# Altium schematic symbol library jlcpcb_2025_04_capacitors_extended_0402.schlib: 3594 symbols (part 12 of 20) (continued)
## FN15N3R3B500PNG
designator C?  Capacitance: 3.3pF  (hidden comment: *)
Capacitor, Ceramic (MLCC), 3.3pF, 50V, C0G, SMD 0402; Manufacturer: PSA(Prosperity Dielectrics); Manufacturer Part Number: FN15N3R3B500PNG; Package Size: 0402; JLCPCB Basic Part: No; JLCPCB Part Number: C565490; Supplier 1: LCSC; Category: Capacitors - MLCC; Supplier Part Number 1: C565490; Voltage Rating: 50V; Temperature Coefficient: C0G; RoHS: Yes; ComponentLink1Description: Datasheet; ComponentLink2Description: JLCPCB Part URL; ComponentLink2URL: https://jlcpcb.com/partdetail/C565490; ComponentLink3Description: LCSC Part URL; ComponentLink3URL: https://lcsc.com/product-detail/Multilayer-Ceramic-Capacitors-MLCC---SMD-SMT_PSAProsperity-Dielectrics-PSAProsperity-Dielectrics-FN15N3R3B500PNG_C565490.html
footprint CAP-0402 (0402 (1005M) Capacitor)
pins: 1, 2

## FN15N3R3C500PNG
designator C?  Capacitance: 3.3pF  (hidden comment: *)
Capacitor, Ceramic (MLCC), 3.3pF, 50V, C0G, SMD 0402; Manufacturer: PSA(Prosperity Dielectrics); Manufacturer Part Number: FN15N3R3C500PNG; Package Size: 0402; JLCPCB Basic Part: No; JLCPCB Part Number: C363519; Supplier 1: LCSC; Category: Capacitors - MLCC; Supplier Part Number 1: C363519; Voltage Rating: 50V; Temperature Coefficient: C0G; RoHS: Yes; ComponentLink1Description: Datasheet; ComponentLink1URL: https://wmsc.lcsc.com/wmsc/upload/file/pdf/v2/lcsc/2304140030_PSA-Prosperity-Dielectrics-FN15N3R3C500PNG_C363519.pdf; ComponentLink2Description: JLCPCB Part URL; ComponentLink2URL: https://jlcpcb.com/partdetail/C363519; ComponentLink3Description: LCSC Part URL; ComponentLink3URL: https://lcsc.com/product-detail/Multilayer-Ceramic-Capacitors-MLCC---SMD-SMT_PSAProsperity-Dielectrics-PSAProsperity-Dielectrics-FN15N3R3C500PNG_C363519.html
footprint CAP-0402 (0402 (1005M) Capacitor)
pins: 1, 2

## FN15N3R9B500PNG
designator C?  Capacitance: 3.9pF  (hidden comment: *)
Capacitor, Ceramic (MLCC), 3.9pF, 50V, C0G, SMD 0402; Manufacturer: PSA(Prosperity Dielectrics); Manufacturer Part Number: FN15N3R9B500PNG; Package Size: 0402; JLCPCB Basic Part: No; JLCPCB Part Number: C565491; Supplier 1: LCSC; Category: Capacitors - MLCC; Supplier Part Number 1: C565491; Voltage Rating: 50V; Temperature Coefficient: C0G; RoHS: Yes; ComponentLink1Description: Datasheet; ComponentLink2Description: JLCPCB Part URL; ComponentLink2URL: https://jlcpcb.com/partdetail/C565491; ComponentLink3Description: LCSC Part URL; ComponentLink3URL: https://lcsc.com/product-detail/Multilayer-Ceramic-Capacitors-MLCC---SMD-SMT_PSAProsperity-Dielectrics-PSAProsperity-Dielectrics-FN15N3R9B500PNG_C565491.html
footprint CAP-0402 (0402 (1005M) Capacitor)
pins: 1, 2

## FN15N3R9C500PNG
designator C?  Capacitance: 3.9pF  (hidden comment: *)
Capacitor, Ceramic (MLCC), 3.9pF, 50V, C0G, SMD 0402; Manufacturer: PSA(Prosperity Dielectrics); Manufacturer Part Number: FN15N3R9C500PNG; Package Size: 0402; JLCPCB Basic Part: No; JLCPCB Part Number: C525213; Supplier 1: LCSC; Category: Capacitors - MLCC; Supplier Part Number 1: C525213; Voltage Rating: 50V; Temperature Coefficient: C0G; RoHS: Yes; ComponentLink1Description: Datasheet; ComponentLink1URL: https://wmsc.lcsc.com/wmsc/upload/file/pdf/v2/lcsc/2304140030_PSA-Prosperity-Dielectrics-FN15N3R9C500PNG_C525213.pdf; ComponentLink2Description: JLCPCB Part URL; ComponentLink2URL: https://jlcpcb.com/partdetail/C525213; ComponentLink3Description: LCSC Part URL; ComponentLink3URL: https://lcsc.com/product-detail/Multilayer-Ceramic-Capacitors-MLCC---SMD-SMT_PSAProsperity-Dielectrics-PSAProsperity-Dielectrics-FN15N3R9C500PNG_C525213.html
footprint CAP-0402 (0402 (1005M) Capacitor)
pins: 1, 2

## FN15N4R0C500PNG
designator C?  Capacitance: 4pF  (hidden comment: *)
Capacitor, Ceramic (MLCC), 4pF, 50V, C0G, SMD 0402; Manufacturer: PSA(Prosperity Dielectrics); Manufacturer Part Number: FN15N4R0C500PNG; Package Size: 0402; JLCPCB Basic Part: No; JLCPCB Part Number: C2847445; Supplier 1: LCSC; Category: Capacitors - MLCC; Supplier Part Number 1: C2847445; Voltage Rating: 50V; Temperature Coefficient: C0G; RoHS: Yes; ComponentLink1Description: Datasheet; ComponentLink1URL: https://wmsc.lcsc.com/wmsc/upload/file/pdf/v2/lcsc/2108142230_PSA-Prosperity-Dielectrics-FN15N4R0C500PNG_C2847445.pdf; ComponentLink2Description: JLCPCB Part URL; ComponentLink2URL: https://jlcpcb.com/partdetail/C2847445; ComponentLink3Description: LCSC Part URL; ComponentLink3URL: https://lcsc.com/product-detail/Multilayer-Ceramic-Capacitors-MLCC---SMD-SMT_PSAProsperity-Dielectrics-PSAProsperity-Dielectrics-FN15N4R0C500PNG_C2847445.html
footprint CAP-0402 (0402 (1005M) Capacitor)
pins: 1, 2

## FN15N4R3B500PNG
designator C?  Capacitance: 4.3pF  (hidden comment: *)
Capacitor, Ceramic (MLCC), 4.3pF, 50V, C0G, SMD 0402; Manufacturer: PSA(Prosperity Dielectrics); Manufacturer Part Number: FN15N4R3B500PNG; Package Size: 0402; JLCPCB Basic Part: No; JLCPCB Part Number: C2929130; Supplier 1: LCSC; Category: Capacitors - MLCC; Supplier Part Number 1: C2929130; Voltage Rating: 50V; Temperature Coefficient: C0G; RoHS: Yes; ComponentLink1Description: Datasheet; ComponentLink1URL: https://wmsc.lcsc.com/wmsc/upload/file/pdf/v2/lcsc/2201121400_PSA-Prosperity-Dielectrics-FN15N4R3B500PNG_C2929130.pdf; ComponentLink2Description: JLCPCB Part URL; ComponentLink2URL: https://jlcpcb.com/partdetail/C2929130; ComponentLink3Description: LCSC Part URL; ComponentLink3URL: https://lcsc.com/product-detail/Multilayer-Ceramic-Capacitors-MLCC---SMD-SMT_PSAProsperity-Dielectrics-PSAProsperity-Dielectrics-FN15N4R3B500PNG_C2929130.html
footprint CAP-0402 (0402 (1005M) Capacitor)
pins: 1, 2

## FN15N4R7B500PNG
designator C?  Capacitance: 4.7pF  (hidden comment: *)
Capacitor, Ceramic (MLCC), 4.7pF, 50V, C0G, SMD 0402; Manufacturer: PSA(Prosperity Dielectrics); Manufacturer Part Number: FN15N4R7B500PNG; Package Size: 0402; JLCPCB Basic Part: No; JLCPCB Part Number: C565492; Supplier 1: LCSC; Category: Capacitors - MLCC; Supplier Part Number 1: C565492; Voltage Rating: 50V; Temperature Coefficient: C0G; RoHS: Yes; ComponentLink1Description: Datasheet; ComponentLink2Description: JLCPCB Part URL; ComponentLink2URL: https://jlcpcb.com/partdetail/C565492; ComponentLink3Description: LCSC Part URL; ComponentLink3URL: https://lcsc.com/product-detail/Multilayer-Ceramic-Capacitors-MLCC---SMD-SMT_PSAProsperity-Dielectrics-PSAProsperity-Dielectrics-FN15N4R7B500PNG_C565492.html
footprint CAP-0402 (0402 (1005M) Capacitor)
pins: 1, 2

## FN15N4R7C500PNG
designator C?  Capacitance: 4.7pF  (hidden comment: *)
Capacitor, Ceramic (MLCC), 4.7pF, 50V, C0G, SMD 0402; Manufacturer: PSA(Prosperity Dielectrics); Manufacturer Part Number: FN15N4R7C500PNG; Package Size: 0402; JLCPCB Basic Part: No; JLCPCB Part Number: C525216; Supplier 1: LCSC; Category: Capacitors - MLCC; Supplier Part Number 1: C525216; Voltage Rating: 50V; Temperature Coefficient: C0G; RoHS: Yes; ComponentLink1Description: Datasheet; ComponentLink1URL: https://wmsc.lcsc.com/wmsc/upload/file/pdf/v2/lcsc/2304140030_PSA-Prosperity-Dielectrics-FN15N4R7C500PNG_C525216.pdf; ComponentLink2Description: JLCPCB Part URL; ComponentLink2URL: https://jlcpcb.com/partdetail/C525216; ComponentLink3Description: LCSC Part URL; ComponentLink3URL: https://lcsc.com/product-detail/Multilayer-Ceramic-Capacitors-MLCC---SMD-SMT_PSAProsperity-Dielectrics-PSAProsperity-Dielectrics-FN15N4R7C500PNG_C525216.html
footprint CAP-0402 (0402 (1005M) Capacitor)
pins: 1, 2

## FN15N5R0C500PNG
designator C?  Capacitance: 5pF  (hidden comment: *)
Capacitor, Ceramic (MLCC), 5pF, 50V, C0G, SMD 0402; Manufacturer: PSA(Prosperity Dielectrics); Manufacturer Part Number: FN15N5R0C500PNG; Package Size: 0402; JLCPCB Basic Part: No; JLCPCB Part Number: C363521; Supplier 1: LCSC; Category: Capacitors - MLCC; Supplier Part Number 1: C363521; Voltage Rating: 50V; Temperature Coefficient: C0G; RoHS: Yes; ComponentLink1Description: Datasheet; ComponentLink1URL: https://wmsc.lcsc.com/wmsc/upload/file/pdf/v2/lcsc/2304140030_PSA-Prosperity-Dielectrics-FN15N5R0C500PNG_C363521.pdf; ComponentLink2Description: JLCPCB Part URL; ComponentLink2URL: https://jlcpcb.com/partdetail/C363521; ComponentLink3Description: LCSC Part URL; ComponentLink3URL: https://lcsc.com/product-detail/Multilayer-Ceramic-Capacitors-MLCC---SMD-SMT_PSAProsperity-Dielectrics-PSAProsperity-Dielectrics-FN15N5R0C500PNG_C363521.html
footprint CAP-0402 (0402 (1005M) Capacitor)
pins: 1, 2

## FN15N5R6C500PNG
designator C?  Capacitance: 5.6pF  (hidden comment: *)
Capacitor, Ceramic (MLCC), 5.6pF, 50V, NP0, SMD 0402; Manufacturer: PSA(Prosperity Dielectrics); Manufacturer Part Number: FN15N5R6C500PNG; Package Size: 0402; JLCPCB Basic Part: No; JLCPCB Part Number: C525218; Supplier 1: LCSC; Category: Capacitors - MLCC; Supplier Part Number 1: C525218; Voltage Rating: 50V; Temperature Coefficient: NP0; RoHS: Yes; ComponentLink1Description: Datasheet; ComponentLink1URL: https://wmsc.lcsc.com/wmsc/upload/file/pdf/v2/lcsc/2304140030_PSA-Prosperity-Dielectrics-FN15N5R6C500PNG_C525218.pdf; ComponentLink2Description: JLCPCB Part URL; ComponentLink2URL: https://jlcpcb.com/partdetail/C525218; ComponentLink3Description: LCSC Part URL; ComponentLink3URL: https://lcsc.com/product-detail/Multilayer-Ceramic-Capacitors-MLCC---SMD-SMT_PSAProsperity-Dielectrics-PSAProsperity-Dielectrics-FN15N5R6C500PNG_C525218.html
footprint CAP-0402 (0402 (1005M) Capacitor)
pins: 1, 2

## FN15N5R6D500PNG
designator C?  Capacitance: 5.6pF  (hidden comment: *)
Capacitor, Ceramic (MLCC), 5.6pF, 50V, C0G, SMD 0402; Manufacturer: PSA(Prosperity Dielectrics); Manufacturer Part Number: FN15N5R6D500PNG; Package Size: 0402; JLCPCB Basic Part: No; JLCPCB Part Number: C525219; Supplier 1: LCSC; Category: Capacitors - MLCC; Supplier Part Number 1: C525219; Voltage Rating: 50V; Temperature Coefficient: C0G; RoHS: Yes; ComponentLink1Description: Datasheet; ComponentLink1URL: https://wmsc.lcsc.com/wmsc/upload/file/pdf/v2/lcsc/2304140030_PSA-Prosperity-Dielectrics-FN15N5R6D500PNG_C525219.pdf; ComponentLink2Description: JLCPCB Part URL; ComponentLink2URL: https://jlcpcb.com/partdetail/C525219; ComponentLink3Description: LCSC Part URL; ComponentLink3URL: https://lcsc.com/product-detail/Multilayer-Ceramic-Capacitors-MLCC---SMD-SMT_PSAProsperity-Dielectrics-PSAProsperity-Dielectrics-FN15N5R6D500PNG_C525219.html
footprint CAP-0402 (0402 (1005M) Capacitor)
pins: 1, 2

## FN15N6R0D500PNG
designator C?  Capacitance: 6pF  (hidden comment: *)
Capacitor, Ceramic (MLCC), 6pF, 50V, C0G, SMD 0402; Manufacturer: PSA(Prosperity Dielectrics); Manufacturer Part Number: FN15N6R0D500PNG; Package Size: 0402; JLCPCB Basic Part: No; JLCPCB Part Number: C2875129; Supplier 1: LCSC; Category: Capacitors - MLCC; Supplier Part Number 1: C2875129; Voltage Rating: 50V; Temperature Coefficient: C0G; RoHS: Yes; ComponentLink1Description: Datasheet; ComponentLink1URL: https://wmsc.lcsc.com/wmsc/upload/file/pdf/v2/lcsc/2109171130_PSA-Prosperity-Dielectrics-FN15N6R0D500PNG_C2875129.pdf; ComponentLink2Description: JLCPCB Part URL; ComponentLink2URL: https://jlcpcb.com/partdetail/C2875129; ComponentLink3Description: LCSC Part URL; ComponentLink3URL: https://lcsc.com/product-detail/Multilayer-Ceramic-Capacitors-MLCC---SMD-SMT_PSAProsperity-Dielectrics-PSAProsperity-Dielectrics-FN15N6R0D500PNG_C2875129.html
footprint CAP-0402 (0402 (1005M) Capacitor)
pins: 1, 2

## FN15N6R8C500PNG
designator C?  Capacitance: 6.8pF  (hidden comment: *)
Capacitor, Ceramic (MLCC), 6.8pF, 50V, SMD 0402; Manufacturer: PSA(Prosperity Dielectrics); Manufacturer Part Number: FN15N6R8C500PNG; Package Size: 0402; JLCPCB Basic Part: No; JLCPCB Part Number: C565493; Supplier 1: LCSC; Category: Capacitors - MLCC; Supplier Part Number 1: C565493; Voltage Rating: 50V; RoHS: Yes; ComponentLink1Description: Datasheet; ComponentLink2Description: JLCPCB Part URL; ComponentLink2URL: https://jlcpcb.com/partdetail/C565493; ComponentLink3Description: LCSC Part URL; ComponentLink3URL: https://lcsc.com/product-detail/Multilayer-Ceramic-Capacitors-MLCC---SMD-SMT_PSAProsperity-Dielectrics-PSAProsperity-Dielectrics-FN15N6R8C500PNG_C565493.html
footprint CAP-0402 (0402 (1005M) Capacitor)
pins: 1, 2

## FN15N6R8D500PNG
designator C?  Capacitance: 6.8pF  (hidden comment: *)
Capacitor, Ceramic (MLCC), 6.8pF, 50V, C0G, SMD 0402; Manufacturer: PSA(Prosperity Dielectrics); Manufacturer Part Number: FN15N6R8D500PNG; Package Size: 0402; JLCPCB Basic Part: No; JLCPCB Part Number: C525221; Supplier 1: LCSC; Category: Capacitors - MLCC; Supplier Part Number 1: C525221; Voltage Rating: 50V; Temperature Coefficient: C0G; RoHS: Yes; ComponentLink1Description: Datasheet; ComponentLink1URL: https://wmsc.lcsc.com/wmsc/upload/file/pdf/v2/lcsc/2304140030_PSA-Prosperity-Dielectrics-FN15N6R8D500PNG_C525221.pdf; ComponentLink2Description: JLCPCB Part URL; ComponentLink2URL: https://jlcpcb.com/partdetail/C525221; ComponentLink3Description: LCSC Part URL; ComponentLink3URL: https://lcsc.com/product-detail/Multilayer-Ceramic-Capacitors-MLCC---SMD-SMT_PSAProsperity-Dielectrics-PSAProsperity-Dielectrics-FN15N6R8D500PNG_C525221.html
footprint CAP-0402 (0402 (1005M) Capacitor)
pins: 1, 2

## FN15N7R0C500PNG
designator C?  Capacitance: 7pF  (hidden comment: *)
Capacitor, Ceramic (MLCC), 7pF, 50V, C0G, SMD 0402; Manufacturer: PSA(Prosperity Dielectrics); Manufacturer Part Number: FN15N7R0C500PNG; Package Size: 0402; JLCPCB Basic Part: No; JLCPCB Part Number: C363522; Supplier 1: LCSC; Category: Capacitors - MLCC; Supplier Part Number 1: C363522; Voltage Rating: 50V; Temperature Coefficient: C0G; RoHS: Yes; ComponentLink1Description: Datasheet; ComponentLink1URL: https://wmsc.lcsc.com/wmsc/upload/file/pdf/v2/lcsc/2304140030_PSA-Prosperity-Dielectrics-FN15N7R0C500PNG_C363522.pdf; ComponentLink2Description: JLCPCB Part URL; ComponentLink2URL: https://jlcpcb.com/partdetail/C363522; ComponentLink3Description: LCSC Part URL; ComponentLink3URL: https://lcsc.com/product-detail/Multilayer-Ceramic-Capacitors-MLCC---SMD-SMT_PSAProsperity-Dielectrics-PSAProsperity-Dielectrics-FN15N7R0C500PNG_C363522.html
footprint CAP-0402 (0402 (1005M) Capacitor)
pins: 1, 2

## FN15N8R2C500PNG
designator C?  Capacitance: 8.2pF  (hidden comment: *)
Capacitor, Ceramic (MLCC), 8.2pF, 50V, C0G, SMD 0402; Manufacturer: PSA(Prosperity Dielectrics); Manufacturer Part Number: FN15N8R2C500PNG; Package Size: 0402; JLCPCB Basic Part: No; JLCPCB Part Number: C565494; Supplier 1: LCSC; Category: Capacitors - MLCC; Supplier Part Number 1: C565494; Voltage Rating: 50V; Temperature Coefficient: C0G; RoHS: Yes; ComponentLink1Description: Datasheet; ComponentLink2Description: JLCPCB Part URL; ComponentLink2URL: https://jlcpcb.com/partdetail/C565494; ComponentLink3Description: LCSC Part URL; ComponentLink3URL: https://lcsc.com/product-detail/Multilayer-Ceramic-Capacitors-MLCC---SMD-SMT_PSAProsperity-Dielectrics-PSAProsperity-Dielectrics-FN15N8R2C500PNG_C565494.html
footprint CAP-0402 (0402 (1005M) Capacitor)
pins: 1, 2

## FN15N100G500PNG
designator C?  Capacitance: 10pF  (hidden comment: *)
Capacitor, Ceramic (MLCC), 10pF, ±2%, 50V, C0G, ±2%, SMD 0402; Manufacturer: PSA(Prosperity Dielectrics); Manufacturer Part Number: FN15N100G500PNG; Package Size: 0402; JLCPCB Basic Part: No; JLCPCB Part Number: C363293; Supplier 1: LCSC; Category: Capacitors - MLCC; Supplier Part Number 1: C363293; Tolerance: ±2%; Voltage Rating: 50V; Temperature Coefficient: C0G; RoHS: Yes; ComponentLink1Description: Datasheet; ComponentLink1URL: https://wmsc.lcsc.com/wmsc/upload/file/pdf/v2/lcsc/2304140030_PSA-Prosperity-Dielectrics-FN15N100G500PNG_C363293.pdf; ComponentLink2Description: JLCPCB Part URL; ComponentLink2URL: https://jlcpcb.com/partdetail/C363293; ComponentLink3Description: LCSC Part URL; ComponentLink3URL: https://lcsc.com/product-detail/Multilayer-Ceramic-Capacitors-MLCC---SMD-SMT_PSAProsperity-Dielectrics-PSAProsperity-Dielectrics-FN15N100G500PNG_C363293.html
footprint CAP-0402 (0402 (1005M) Capacitor)
pins: 1, 2

## FN15N100J500PNG
designator C?  Capacitance: 10pF  (hidden comment: *)
Capacitor, Ceramic (MLCC), 10pF, ±5%, 50V, C0G, ±5%, SMD 0402; Manufacturer: PSA(Prosperity Dielectrics); Manufacturer Part Number: FN15N100J500PNG; Package Size: 0402; JLCPCB Basic Part: No; JLCPCB Part Number: C328913; Supplier 1: LCSC; Category: Capacitors - MLCC; Supplier Part Number 1: C328913; Tolerance: ±5%; Voltage Rating: 50V; Temperature Coefficient: C0G; RoHS: Yes; ComponentLink1Description: Datasheet; ComponentLink1URL: https://wmsc.lcsc.com/wmsc/upload/file/pdf/v2/lcsc/2304140030_PSA-Prosperity-Dielectrics-FN15N100J500PNG_C328913.pdf; ComponentLink2Description: JLCPCB Part URL; ComponentLink2URL: https://jlcpcb.com/partdetail/C328913; ComponentLink3Description: LCSC Part URL; ComponentLink3URL: https://lcsc.com/product-detail/Multilayer-Ceramic-Capacitors-MLCC---SMD-SMT_PSAProsperity-Dielectrics-PSAProsperity-Dielectrics-FN15N100J500PNG_C328913.html
footprint CAP-0402 (0402 (1005M) Capacitor)
pins: 1, 2

## FN15N101G500PNG
designator C?  Capacitance: 100pF  (hidden comment: *)
Capacitor, Ceramic (MLCC), 100pF, 50V, C0G, SMD 0402; Manufacturer: PSA(Prosperity Dielectrics); Manufacturer Part Number: FN15N101G500PNG; Package Size: 0402; JLCPCB Basic Part: No; JLCPCB Part Number: C2929128; Supplier 1: LCSC; Category: Capacitors - MLCC; Supplier Part Number 1: C2929128; Voltage Rating: 50V; Temperature Coefficient: C0G; RoHS: Yes; ComponentLink1Description: Datasheet; ComponentLink1URL: https://wmsc.lcsc.com/wmsc/upload/file/pdf/v2/lcsc/2201121400_PSA-Prosperity-Dielectrics-FN15N101G500PNG_C2929128.pdf; ComponentLink2Description: JLCPCB Part URL; ComponentLink2URL: https://jlcpcb.com/partdetail/C2929128; ComponentLink3Description: LCSC Part URL; ComponentLink3URL: https://lcsc.com/product-detail/Multilayer-Ceramic-Capacitors-MLCC---SMD-SMT_PSAProsperity-Dielectrics-PSAProsperity-Dielectrics-FN15N101G500PNG_C2929128.html
footprint CAP-0402 (0402 (1005M) Capacitor)
pins: 1, 2

## FN15N101J500PNG
designator C?  Capacitance: 100pF  (hidden comment: *)
Capacitor, Ceramic (MLCC), 100pF, ±5%, 50V, C0G, ±5%, SMD 0402; Manufacturer: PSA(Prosperity Dielectrics); Manufacturer Part Number: FN15N101J500PNG; Package Size: 0402; JLCPCB Basic Part: No; JLCPCB Part Number: C235727; Supplier 1: LCSC; Category: Capacitors - MLCC; Supplier Part Number 1: C235727; Tolerance: ±5%; Voltage Rating: 50V; Temperature Coefficient: C0G; RoHS: Yes; ComponentLink1Description: Datasheet; ComponentLink1URL: https://wmsc.lcsc.com/wmsc/upload/file/pdf/v2/lcsc/2304140030_PSA-Prosperity-Dielectrics-FN15N101J500PNG_C235727.pdf; ComponentLink2Description: JLCPCB Part URL; ComponentLink2URL: https://jlcpcb.com/partdetail/C235727; ComponentLink3Description: LCSC Part URL; ComponentLink3URL: https://lcsc.com/product-detail/Multilayer-Ceramic-Capacitors-MLCC---SMD-SMT_PSAProsperity-Dielectrics-PSAProsperity-Dielectrics-FN15N101J500PNG_C235727.html
footprint CAP-0402 (0402 (1005M) Capacitor)
pins: 1, 2

## FN15N102J500PNG
designator C?  Capacitance: 1nF  (hidden comment: *)
Capacitor, Ceramic (MLCC), 1nF, ±5%, 50V, NP0, ±5%, SMD 0402; Manufacturer: PSA(Prosperity Dielectrics); Manufacturer Part Number: FN15N102J500PNG; Package Size: 0402; JLCPCB Basic Part: No; JLCPCB Part Number: C525198; Supplier 1: LCSC; Category: Capacitors - MLCC; Supplier Part Number 1: C525198; Tolerance: ±5%; Voltage Rating: 50V; Temperature Coefficient: NP0; RoHS: Yes; ComponentLink1Description: Datasheet; ComponentLink1URL: https://wmsc.lcsc.com/wmsc/upload/file/pdf/v2/lcsc/2304140030_PSA-Prosperity-Dielectrics-FN15N102J500PNG_C525198.pdf; ComponentLink2Description: JLCPCB Part URL; ComponentLink2URL: https://jlcpcb.com/partdetail/C525198; ComponentLink3Description: LCSC Part URL; ComponentLink3URL: https://lcsc.com/product-detail/Multilayer-Ceramic-Capacitors-MLCC---SMD-SMT_PSAProsperity-Dielectrics-PSAProsperity-Dielectrics-FN15N102J500PNG_C525198.html
footprint CAP-0402 (0402 (1005M) Capacitor)
pins: 1, 2

## FN15N120J500PNG
designator C?  Capacitance: 12pF  (hidden comment: *)
Capacitor, Ceramic (MLCC), 12pF, ±5%, 50V, C0G, ±5%, SMD 0402; Manufacturer: PSA(Prosperity Dielectrics); Manufacturer Part Number: FN15N120J500PNG; Package Size: 0402; JLCPCB Basic Part: No; JLCPCB Part Number: C525199; Supplier 1: LCSC; Category: Capacitors - MLCC; Supplier Part Number 1: C525199; Tolerance: ±5%; Voltage Rating: 50V; Temperature Coefficient: C0G; RoHS: Yes; ComponentLink1Description: Datasheet; ComponentLink1URL: https://wmsc.lcsc.com/wmsc/upload/file/pdf/v2/lcsc/2304140030_PSA-Prosperity-Dielectrics-FN15N120J500PNG_C525199.pdf; ComponentLink2Description: JLCPCB Part URL; ComponentLink2URL: https://jlcpcb.com/partdetail/C525199; ComponentLink3Description: LCSC Part URL; ComponentLink3URL: https://lcsc.com/product-detail/Multilayer-Ceramic-Capacitors-MLCC---SMD-SMT_PSAProsperity-Dielectrics-PSAProsperity-Dielectrics-FN15N120J500PNG_C525199.html
footprint CAP-0402 (0402 (1005M) Capacitor)
pins: 1, 2

## FN15N121J500PNG
designator C?  Capacitance: 120pF  (hidden comment: *)
Capacitor, Ceramic (MLCC), 120pF, ±5%, 50V, C0G, ±5%, SMD 0402; Manufacturer: PSA(Prosperity Dielectrics); Manufacturer Part Number: FN15N121J500PNG; Package Size: 0402; JLCPCB Basic Part: No; JLCPCB Part Number: C363294; Supplier 1: LCSC; Category: Capacitors - MLCC; Supplier Part Number 1: C363294; Tolerance: ±5%; Voltage Rating: 50V; Temperature Coefficient: C0G; RoHS: Yes; ComponentLink1Description: Datasheet; ComponentLink1URL: https://wmsc.lcsc.com/wmsc/upload/file/pdf/v2/lcsc/2304140030_PSA-Prosperity-Dielectrics-FN15N121J500PNG_C363294.pdf; ComponentLink2Description: JLCPCB Part URL; ComponentLink2URL: https://jlcpcb.com/partdetail/C363294; ComponentLink3Description: LCSC Part URL; ComponentLink3URL: https://lcsc.com/product-detail/Multilayer-Ceramic-Capacitors-MLCC---SMD-SMT_PSAProsperity-Dielectrics-PSAProsperity-Dielectrics-FN15N121J500PNG_C363294.html
footprint CAP-0402 (0402 (1005M) Capacitor)
pins: 1, 2

## FN15N150G500PNG
designator C?  Capacitance: 15pF  (hidden comment: *)
Capacitor, Ceramic (MLCC), 15pF, ±2%, 50V, null, ±2%, SMD 0402; Manufacturer: PSA(Prosperity Dielectrics); Manufacturer Part Number: FN15N150G500PNG; Package Size: 0402; JLCPCB Basic Part: No; JLCPCB Part Number: C2929708; Supplier 1: LCSC; Category: Capacitors - MLCC; Supplier Part Number 1: C2929708; Tolerance: ±2%; Voltage Rating: 50V; Temperature Coefficient: null; RoHS: Yes; ComponentLink1Description: Datasheet; ComponentLink1URL: https://wmsc.lcsc.com/wmsc/upload/file/pdf/v2/lcsc/2211091800_PSA-Prosperity-Dielectrics-FN15N150G500PNG_C2929708.pdf; ComponentLink2Description: JLCPCB Part URL; ComponentLink2URL: https://jlcpcb.com/partdetail/C2929708; ComponentLink3Description: LCSC Part URL; ComponentLink3URL: https://lcsc.com/product-detail/Multilayer-Ceramic-Capacitors-MLCC---SMD-SMT_PSAProsperity-Dielectrics-PSAProsperity-Dielectrics-FN15N150G500PNG_C2929708.html
footprint CAP-0402 (0402 (1005M) Capacitor)
pins: 1, 2

## FN15N150J500PNG
designator C?  Capacitance: 15pF  (hidden comment: *)
Capacitor, Ceramic (MLCC), 15pF, ±5%, 50V, C0G, ±5%, SMD 0402; Manufacturer: PSA(Prosperity Dielectrics); Manufacturer Part Number: FN15N150J500PNG; Package Size: 0402; JLCPCB Basic Part: No; JLCPCB Part Number: C525200; Supplier 1: LCSC; Category: Capacitors - MLCC; Supplier Part Number 1: C525200; Tolerance: ±5%; Voltage Rating: 50V; Temperature Coefficient: C0G; RoHS: Yes; ComponentLink1Description: Datasheet; ComponentLink1URL: https://wmsc.lcsc.com/wmsc/upload/file/pdf/v2/lcsc/2304140030_PSA-Prosperity-Dielectrics-FN15N150J500PNG_C525200.pdf; ComponentLink2Description: JLCPCB Part URL; ComponentLink2URL: https://jlcpcb.com/partdetail/C525200; ComponentLink3Description: LCSC Part URL; ComponentLink3URL: https://lcsc.com/product-detail/Multilayer-Ceramic-Capacitors-MLCC---SMD-SMT_PSAProsperity-Dielectrics-PSAProsperity-Dielectrics-FN15N150J500PNG_C525200.html
footprint CAP-0402 (0402 (1005M) Capacitor)
pins: 1, 2

## FN15N180G500PNG
designator C?  Capacitance: 18pF  (hidden comment: *)
Capacitor, Ceramic (MLCC), 18pF, ±2%, 50V, C0G, ±2%, SMD 0402; Manufacturer: PSA(Prosperity Dielectrics); Manufacturer Part Number: FN15N180G500PNG; Package Size: 0402; JLCPCB Basic Part: No; JLCPCB Part Number: C2929700; Supplier 1: LCSC; Category: Capacitors - MLCC; Supplier Part Number 1: C2929700; Tolerance: ±2%; Voltage Rating: 50V; Temperature Coefficient: C0G; RoHS: Yes; ComponentLink1Description: Datasheet; ComponentLink1URL: https://wmsc.lcsc.com/wmsc/upload/file/pdf/v2/lcsc/2201121430_PSA-Prosperity-Dielectrics-FN15N180G500PNG_C2929700.pdf; ComponentLink2Description: JLCPCB Part URL; ComponentLink2URL: https://jlcpcb.com/partdetail/C2929700; ComponentLink3Description: LCSC Part URL; ComponentLink3URL: https://lcsc.com/product-detail/Multilayer-Ceramic-Capacitors-MLCC---SMD-SMT_PSAProsperity-Dielectrics-PSAProsperity-Dielectrics-FN15N180G500PNG_C2929700.html
footprint CAP-0402 (0402 (1005M) Capacitor)
pins: 1, 2

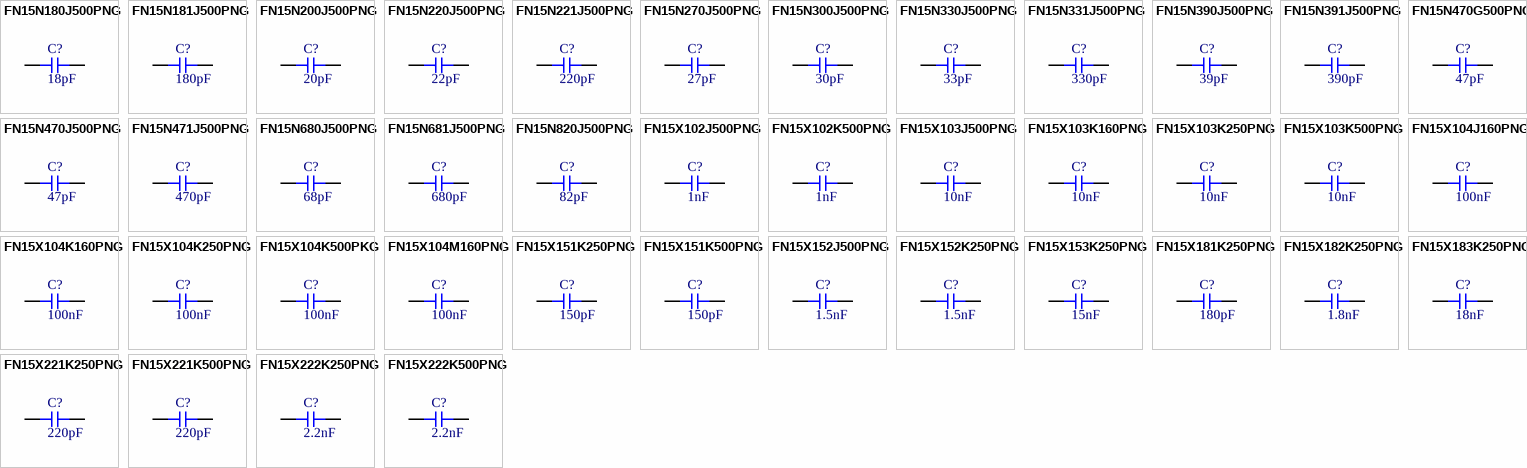
[diagram p53: symbols FN15N180J500PNG to FN15X222K500PNG]

## FN15N180J500PNG
designator C?  Capacitance: 18pF  (hidden comment: *)
Capacitor, Ceramic (MLCC), 18pF, ±5%, 50V, C0G, ±5%, SMD 0402; Manufacturer: PSA(Prosperity Dielectrics); Manufacturer Part Number: FN15N180J500PNG; Package Size: 0402; JLCPCB Basic Part: No; JLCPCB Part Number: C363512; Supplier 1: LCSC; Category: Capacitors - MLCC; Supplier Part Number 1: C363512; Tolerance: ±5%; Voltage Rating: 50V; Temperature Coefficient: C0G; RoHS: Yes; ComponentLink1Description: Datasheet; ComponentLink1URL: https://wmsc.lcsc.com/wmsc/upload/file/pdf/v2/lcsc/2304140030_PSA-Prosperity-Dielectrics-FN15N180J500PNG_C363512.pdf; ComponentLink2Description: JLCPCB Part URL; ComponentLink2URL: https://jlcpcb.com/partdetail/C363512; ComponentLink3Description: LCSC Part URL; ComponentLink3URL: https://lcsc.com/product-detail/Multilayer-Ceramic-Capacitors-MLCC---SMD-SMT_PSAProsperity-Dielectrics-PSAProsperity-Dielectrics-FN15N180J500PNG_C363512.html
footprint CAP-0402 (0402 (1005M) Capacitor)
pins: 1, 2

## FN15N181J500PNG
designator C?  Capacitance: 180pF  (hidden comment: *)
Capacitor, Ceramic (MLCC), 180pF, ±5%, 50V, NP0, ±5%, SMD 0402; Manufacturer: PSA(Prosperity Dielectrics); Manufacturer Part Number: FN15N181J500PNG; Package Size: 0402; JLCPCB Basic Part: No; JLCPCB Part Number: C525201; Supplier 1: LCSC; Category: Capacitors - MLCC; Supplier Part Number 1: C525201; Tolerance: ±5%; Voltage Rating: 50V; Temperature Coefficient: NP0; RoHS: Yes; ComponentLink1Description: Datasheet; ComponentLink1URL: https://wmsc.lcsc.com/wmsc/upload/file/pdf/v2/lcsc/2304140030_PSA-Prosperity-Dielectrics-FN15N181J500PNG_C525201.pdf; ComponentLink2Description: JLCPCB Part URL; ComponentLink2URL: https://jlcpcb.com/partdetail/C525201; ComponentLink3Description: LCSC Part URL; ComponentLink3URL: https://lcsc.com/product-detail/Multilayer-Ceramic-Capacitors-MLCC---SMD-SMT_PSAProsperity-Dielectrics-PSAProsperity-Dielectrics-FN15N181J500PNG_C525201.html
footprint CAP-0402 (0402 (1005M) Capacitor)
pins: 1, 2

## FN15N200J500PNG
designator C?  Capacitance: 20pF  (hidden comment: *)
Capacitor, Ceramic (MLCC), 20pF, ±5%, 50V, C0G, ±5%, SMD 0402; Manufacturer: PSA(Prosperity Dielectrics); Manufacturer Part Number: FN15N200J500PNG; Package Size: 0402; JLCPCB Basic Part: No; JLCPCB Part Number: C363292; Supplier 1: LCSC; Category: Capacitors - MLCC; Supplier Part Number 1: C363292; Tolerance: ±5%; Voltage Rating: 50V; Temperature Coefficient: C0G; RoHS: Yes; ComponentLink1Description: Datasheet; ComponentLink1URL: https://wmsc.lcsc.com/wmsc/upload/file/pdf/v2/lcsc/2304140030_PSA-Prosperity-Dielectrics-FN15N200J500PNG_C363292.pdf; ComponentLink2Description: JLCPCB Part URL; ComponentLink2URL: https://jlcpcb.com/partdetail/C363292; ComponentLink3Description: LCSC Part URL; ComponentLink3URL: https://lcsc.com/product-detail/Multilayer-Ceramic-Capacitors-MLCC---SMD-SMT_PSAProsperity-Dielectrics-PSAProsperity-Dielectrics-FN15N200J500PNG_C363292.html
footprint CAP-0402 (0402 (1005M) Capacitor)
pins: 1, 2

## FN15N220J500PNG
designator C?  Capacitance: 22pF  (hidden comment: *)
Capacitor, Ceramic (MLCC), 22pF, ±5%, 50V, NP0, ±5%, SMD 0402; Manufacturer: PSA(Prosperity Dielectrics); Manufacturer Part Number: FN15N220J500PNG; Package Size: 0402; JLCPCB Basic Part: No; JLCPCB Part Number: C525204; Supplier 1: LCSC; Category: Capacitors - MLCC; Supplier Part Number 1: C525204; Tolerance: ±5%; Voltage Rating: 50V; Temperature Coefficient: NP0; RoHS: Yes; ComponentLink1Description: Datasheet; ComponentLink1URL: https://wmsc.lcsc.com/wmsc/upload/file/pdf/v2/lcsc/2304140030_PSA-Prosperity-Dielectrics-FN15N220J500PNG_C525204.pdf; ComponentLink2Description: JLCPCB Part URL; ComponentLink2URL: https://jlcpcb.com/partdetail/C525204; ComponentLink3Description: LCSC Part URL; ComponentLink3URL: https://lcsc.com/product-detail/Multilayer-Ceramic-Capacitors-MLCC---SMD-SMT_PSAProsperity-Dielectrics-PSAProsperity-Dielectrics-FN15N220J500PNG_C525204.html
footprint CAP-0402 (0402 (1005M) Capacitor)
pins: 1, 2

## FN15N221J500PNG
designator C?  Capacitance: 220pF  (hidden comment: *)
Capacitor, Ceramic (MLCC), 220pF, ±5%, 50V, C0G, ±5%, SMD 0402; Manufacturer: PSA(Prosperity Dielectrics); Manufacturer Part Number: FN15N221J500PNG; Package Size: 0402; JLCPCB Basic Part: No; JLCPCB Part Number: C363516; Supplier 1: LCSC; Category: Capacitors - MLCC; Supplier Part Number 1: C363516; Tolerance: ±5%; Voltage Rating: 50V; Temperature Coefficient: C0G; RoHS: Yes; ComponentLink1Description: Datasheet; ComponentLink1URL: https://wmsc.lcsc.com/wmsc/upload/file/pdf/v2/lcsc/2304140030_PSA-Prosperity-Dielectrics-FN15N221J500PNG_C363516.pdf; ComponentLink2Description: JLCPCB Part URL; ComponentLink2URL: https://jlcpcb.com/partdetail/C363516; ComponentLink3Description: LCSC Part URL; ComponentLink3URL: https://lcsc.com/product-detail/Multilayer-Ceramic-Capacitors-MLCC---SMD-SMT_PSAProsperity-Dielectrics-PSAProsperity-Dielectrics-FN15N221J500PNG_C363516.html
footprint CAP-0402 (0402 (1005M) Capacitor)
pins: 1, 2

## FN15N270J500PNG
designator C?  Capacitance: 27pF  (hidden comment: *)
Capacitor, Ceramic (MLCC), 27pF, ±5%, 50V, C0G, ±5%, SMD 0402; Manufacturer: PSA(Prosperity Dielectrics); Manufacturer Part Number: FN15N270J500PNG; Package Size: 0402; JLCPCB Basic Part: No; JLCPCB Part Number: C525205; Supplier 1: LCSC; Category: Capacitors - MLCC; Supplier Part Number 1: C525205; Tolerance: ±5%; Voltage Rating: 50V; Temperature Coefficient: C0G; RoHS: Yes; ComponentLink1Description: Datasheet; ComponentLink1URL: https://wmsc.lcsc.com/wmsc/upload/file/pdf/v2/lcsc/2304140030_PSA-Prosperity-Dielectrics-FN15N270J500PNG_C525205.pdf; ComponentLink2Description: JLCPCB Part URL; ComponentLink2URL: https://jlcpcb.com/partdetail/C525205; ComponentLink3Description: LCSC Part URL; ComponentLink3URL: https://lcsc.com/product-detail/Multilayer-Ceramic-Capacitors-MLCC---SMD-SMT_PSAProsperity-Dielectrics-PSAProsperity-Dielectrics-FN15N270J500PNG_C525205.html
footprint CAP-0402 (0402 (1005M) Capacitor)
pins: 1, 2

## FN15N300J500PNG
designator C?  Capacitance: 30pF  (hidden comment: *)
Capacitor, Ceramic (MLCC), 30pF, ±5%, 50V, NP0, ±5%, SMD 0402; Manufacturer: PSA(Prosperity Dielectrics); Manufacturer Part Number: FN15N300J500PNG; Package Size: 0402; JLCPCB Basic Part: No; JLCPCB Part Number: C525209; Supplier 1: LCSC; Category: Capacitors - MLCC; Supplier Part Number 1: C525209; Tolerance: ±5%; Voltage Rating: 50V; Temperature Coefficient: NP0; RoHS: Yes; ComponentLink1Description: Datasheet; ComponentLink1URL: https://wmsc.lcsc.com/wmsc/upload/file/pdf/v2/lcsc/2304140030_PSA-Prosperity-Dielectrics-FN15N300J500PNG_C525209.pdf; ComponentLink2Description: JLCPCB Part URL; ComponentLink2URL: https://jlcpcb.com/partdetail/C525209; ComponentLink3Description: LCSC Part URL; ComponentLink3URL: https://lcsc.com/product-detail/Multilayer-Ceramic-Capacitors-MLCC---SMD-SMT_PSAProsperity-Dielectrics-PSAProsperity-Dielectrics-FN15N300J500PNG_C525209.html
footprint CAP-0402 (0402 (1005M) Capacitor)
pins: 1, 2

## FN15N330J500PNG
designator C?  Capacitance: 33pF  (hidden comment: *)
Capacitor, Ceramic (MLCC), 33pF, ±5%, 50V, C0G, ±5%, SMD 0402; Manufacturer: PSA(Prosperity Dielectrics); Manufacturer Part Number: FN15N330J500PNG; Package Size: 0402; JLCPCB Basic Part: No; JLCPCB Part Number: C525210; Supplier 1: LCSC; Category: Capacitors - MLCC; Supplier Part Number 1: C525210; Tolerance: ±5%; Voltage Rating: 50V; Temperature Coefficient: C0G; RoHS: Yes; ComponentLink1Description: Datasheet; ComponentLink1URL: https://wmsc.lcsc.com/wmsc/upload/file/pdf/v2/lcsc/2304140030_PSA-Prosperity-Dielectrics-FN15N330J500PNG_C525210.pdf; ComponentLink2Description: JLCPCB Part URL; ComponentLink2URL: https://jlcpcb.com/partdetail/C525210; ComponentLink3Description: LCSC Part URL; ComponentLink3URL: https://lcsc.com/product-detail/Multilayer-Ceramic-Capacitors-MLCC---SMD-SMT_PSAProsperity-Dielectrics-PSAProsperity-Dielectrics-FN15N330J500PNG_C525210.html
footprint CAP-0402 (0402 (1005M) Capacitor)
pins: 1, 2

## FN15N331J500PNG
designator C?  Capacitance: 330pF  (hidden comment: *)
Capacitor, Ceramic (MLCC), 330pF, ±5%, 50V, C0G, ±5%, SMD 0402; Manufacturer: PSA(Prosperity Dielectrics); Manufacturer Part Number: FN15N331J500PNG; Package Size: 0402; JLCPCB Basic Part: No; JLCPCB Part Number: C525211; Supplier 1: LCSC; Category: Capacitors - MLCC; Supplier Part Number 1: C525211; Tolerance: ±5%; Voltage Rating: 50V; Temperature Coefficient: C0G; RoHS: Yes; ComponentLink1Description: Datasheet; ComponentLink1URL: https://wmsc.lcsc.com/wmsc/upload/file/pdf/v2/lcsc/2304140030_PSA-Prosperity-Dielectrics-FN15N331J500PNG_C525211.pdf; ComponentLink2Description: JLCPCB Part URL; ComponentLink2URL: https://jlcpcb.com/partdetail/C525211; ComponentLink3Description: LCSC Part URL; ComponentLink3URL: https://lcsc.com/product-detail/Multilayer-Ceramic-Capacitors-MLCC---SMD-SMT_PSAProsperity-Dielectrics-PSAProsperity-Dielectrics-FN15N331J500PNG_C525211.html
footprint CAP-0402 (0402 (1005M) Capacitor)
pins: 1, 2

## FN15N390J500PNG
designator C?  Capacitance: 39pF  (hidden comment: *)
Capacitor, Ceramic (MLCC), 39pF, ±5%, 50V, NP0, ±5%, SMD 0402; Manufacturer: PSA(Prosperity Dielectrics); Manufacturer Part Number: FN15N390J500PNG; Package Size: 0402; JLCPCB Basic Part: No; JLCPCB Part Number: C525212; Supplier 1: LCSC; Category: Capacitors - MLCC; Supplier Part Number 1: C525212; Tolerance: ±5%; Voltage Rating: 50V; Temperature Coefficient: NP0; RoHS: Yes; ComponentLink1Description: Datasheet; ComponentLink1URL: https://wmsc.lcsc.com/wmsc/upload/file/pdf/v2/lcsc/2304140030_PSA-Prosperity-Dielectrics-FN15N390J500PNG_C525212.pdf; ComponentLink2Description: JLCPCB Part URL; ComponentLink2URL: https://jlcpcb.com/partdetail/C525212; ComponentLink3Description: LCSC Part URL; ComponentLink3URL: https://lcsc.com/product-detail/Multilayer-Ceramic-Capacitors-MLCC---SMD-SMT_PSAProsperity-Dielectrics-PSAProsperity-Dielectrics-FN15N390J500PNG_C525212.html
footprint CAP-0402 (0402 (1005M) Capacitor)
pins: 1, 2

## FN15N391J500PNG
designator C?  Capacitance: 390pF  (hidden comment: *)
Capacitor, Ceramic (MLCC), 390pF, ±5%, 50V, C0G, ±5%, SMD 0402; Manufacturer: PSA(Prosperity Dielectrics); Manufacturer Part Number: FN15N391J500PNG; Package Size: 0402; JLCPCB Basic Part: No; JLCPCB Part Number: C363517; Supplier 1: LCSC; Category: Capacitors - MLCC; Supplier Part Number 1: C363517; Tolerance: ±5%; Voltage Rating: 50V; Temperature Coefficient: C0G; RoHS: Yes; ComponentLink1Description: Datasheet; ComponentLink1URL: https://wmsc.lcsc.com/wmsc/upload/file/pdf/v2/lcsc/2304140030_PSA-Prosperity-Dielectrics-FN15N391J500PNG_C363517.pdf; ComponentLink2Description: JLCPCB Part URL; ComponentLink2URL: https://jlcpcb.com/partdetail/C363517; ComponentLink3Description: LCSC Part URL; ComponentLink3URL: https://lcsc.com/product-detail/Multilayer-Ceramic-Capacitors-MLCC---SMD-SMT_PSAProsperity-Dielectrics-PSAProsperity-Dielectrics-FN15N391J500PNG_C363517.html
footprint CAP-0402 (0402 (1005M) Capacitor)
pins: 1, 2

## FN15N470G500PNG
designator C?  Capacitance: 47pF  (hidden comment: *)
Capacitor, Ceramic (MLCC), 47pF, ±2%, 50V, NP0, ±2%, SMD 0402; Manufacturer: PSA(Prosperity Dielectrics); Manufacturer Part Number: FN15N470G500PNG; Package Size: 0402; JLCPCB Basic Part: No; JLCPCB Part Number: C525214; Supplier 1: LCSC; Category: Capacitors - MLCC; Supplier Part Number 1: C525214; Tolerance: ±2%; Voltage Rating: 50V; Temperature Coefficient: NP0; RoHS: Yes; ComponentLink1Description: Datasheet; ComponentLink1URL: https://wmsc.lcsc.com/wmsc/upload/file/pdf/v2/lcsc/2304140030_PSA-Prosperity-Dielectrics-FN15N470G500PNG_C525214.pdf; ComponentLink2Description: JLCPCB Part URL; ComponentLink2URL: https://jlcpcb.com/partdetail/C525214; ComponentLink3Description: LCSC Part URL; ComponentLink3URL: https://lcsc.com/product-detail/Multilayer-Ceramic-Capacitors-MLCC---SMD-SMT_PSAProsperity-Dielectrics-PSAProsperity-Dielectrics-FN15N470G500PNG_C525214.html
footprint CAP-0402 (0402 (1005M) Capacitor)
pins: 1, 2

## FN15N470J500PNG
designator C?  Capacitance: 47pF  (hidden comment: *)
Capacitor, Ceramic (MLCC), 47pF, ±5%, 50V, C0G, ±5%, SMD 0402; Manufacturer: PSA(Prosperity Dielectrics); Manufacturer Part Number: FN15N470J500PNG; Package Size: 0402; JLCPCB Basic Part: No; JLCPCB Part Number: C525215; Supplier 1: LCSC; Category: Capacitors - MLCC; Supplier Part Number 1: C525215; Tolerance: ±5%; Voltage Rating: 50V; Temperature Coefficient: C0G; RoHS: Yes; ComponentLink1Description: Datasheet; ComponentLink1URL: https://wmsc.lcsc.com/wmsc/upload/file/pdf/v2/lcsc/2304140030_PSA-Prosperity-Dielectrics-FN15N470J500PNG_C525215.pdf; ComponentLink2Description: JLCPCB Part URL; ComponentLink2URL: https://jlcpcb.com/partdetail/C525215; ComponentLink3Description: LCSC Part URL; ComponentLink3URL: https://lcsc.com/product-detail/Multilayer-Ceramic-Capacitors-MLCC---SMD-SMT_PSAProsperity-Dielectrics-PSAProsperity-Dielectrics-FN15N470J500PNG_C525215.html
footprint CAP-0402 (0402 (1005M) Capacitor)
pins: 1, 2

## FN15N471J500PNG
designator C?  Capacitance: 470pF  (hidden comment: *)
Capacitor, Ceramic (MLCC), 470pF, ±5%, 50V, C0G, ±5%, SMD 0402; Manufacturer: PSA(Prosperity Dielectrics); Manufacturer Part Number: FN15N471J500PNG; Package Size: 0402; JLCPCB Basic Part: No; JLCPCB Part Number: C363520; Supplier 1: LCSC; Category: Capacitors - MLCC; Supplier Part Number 1: C363520; Tolerance: ±5%; Voltage Rating: 50V; Temperature Coefficient: C0G; RoHS: Yes; ComponentLink1Description: Datasheet; ComponentLink1URL: https://wmsc.lcsc.com/wmsc/upload/file/pdf/v2/lcsc/2304140030_PSA-Prosperity-Dielectrics-FN15N471J500PNG_C363520.pdf; ComponentLink2Description: JLCPCB Part URL; ComponentLink2URL: https://jlcpcb.com/partdetail/C363520; ComponentLink3Description: LCSC Part URL; ComponentLink3URL: https://lcsc.com/product-detail/Multilayer-Ceramic-Capacitors-MLCC---SMD-SMT_PSAProsperity-Dielectrics-PSAProsperity-Dielectrics-FN15N471J500PNG_C363520.html
footprint CAP-0402 (0402 (1005M) Capacitor)
pins: 1, 2

## FN15N680J500PNG
designator C?  Capacitance: 68pF  (hidden comment: *)
Capacitor, Ceramic (MLCC), 68pF, ±5%, 50V, C0G, ±5%, SMD 0402; Manufacturer: PSA(Prosperity Dielectrics); Manufacturer Part Number: FN15N680J500PNG; Package Size: 0402; JLCPCB Basic Part: No; JLCPCB Part Number: C525220; Supplier 1: LCSC; Category: Capacitors - MLCC; Supplier Part Number 1: C525220; Tolerance: ±5%; Voltage Rating: 50V; Temperature Coefficient: C0G; RoHS: Yes; ComponentLink1Description: Datasheet; ComponentLink1URL: https://wmsc.lcsc.com/wmsc/upload/file/pdf/v2/lcsc/2304140030_PSA-Prosperity-Dielectrics-FN15N680J500PNG_C525220.pdf; ComponentLink2Description: JLCPCB Part URL; ComponentLink2URL: https://jlcpcb.com/partdetail/C525220; ComponentLink3Description: LCSC Part URL; ComponentLink3URL: https://lcsc.com/product-detail/Multilayer-Ceramic-Capacitors-MLCC---SMD-SMT_PSAProsperity-Dielectrics-PSAProsperity-Dielectrics-FN15N680J500PNG_C525220.html
footprint CAP-0402 (0402 (1005M) Capacitor)
pins: 1, 2

## FN15N681J500PNG
designator C?  Capacitance: 680pF  (hidden comment: *)
Capacitor, Ceramic (MLCC), 680pF, ±5%, 50V, C0G, ±5%, SMD 0402; Manufacturer: PSA(Prosperity Dielectrics); Manufacturer Part Number: FN15N681J500PNG; Package Size: 0402; JLCPCB Basic Part: No; JLCPCB Part Number: C565499; Supplier 1: LCSC; Category: Capacitors - MLCC; Supplier Part Number 1: C565499; Tolerance: ±5%; Voltage Rating: 50V; Temperature Coefficient: C0G; RoHS: Yes; ComponentLink1Description: Datasheet; ComponentLink2Description: JLCPCB Part URL; ComponentLink2URL: https://jlcpcb.com/partdetail/C565499; ComponentLink3Description: LCSC Part URL; ComponentLink3URL: https://lcsc.com/product-detail/Multilayer-Ceramic-Capacitors-MLCC---SMD-SMT_PSAProsperity-Dielectrics-PSAProsperity-Dielectrics-FN15N681J500PNG_C565499.html
footprint CAP-0402 (0402 (1005M) Capacitor)
pins: 1, 2

## FN15N820J500PNG
designator C?  Capacitance: 82pF  (hidden comment: *)
Capacitor, Ceramic (MLCC), 82pF, ±5%, 50V, C0G, ±5%, SMD 0402; Manufacturer: PSA(Prosperity Dielectrics); Manufacturer Part Number: FN15N820J500PNG; Package Size: 0402; JLCPCB Basic Part: No; JLCPCB Part Number: C525222; Supplier 1: LCSC; Category: Capacitors - MLCC; Supplier Part Number 1: C525222; Tolerance: ±5%; Voltage Rating: 50V; Temperature Coefficient: C0G; RoHS: Yes; ComponentLink1Description: Datasheet; ComponentLink1URL: https://wmsc.lcsc.com/wmsc/upload/file/pdf/v2/lcsc/2304140030_PSA-Prosperity-Dielectrics-FN15N820J500PNG_C525222.pdf; ComponentLink2Description: JLCPCB Part URL; ComponentLink2URL: https://jlcpcb.com/partdetail/C525222; ComponentLink3Description: LCSC Part URL; ComponentLink3URL: https://lcsc.com/product-detail/Multilayer-Ceramic-Capacitors-MLCC---SMD-SMT_PSAProsperity-Dielectrics-PSAProsperity-Dielectrics-FN15N820J500PNG_C525222.html
footprint CAP-0402 (0402 (1005M) Capacitor)
pins: 1, 2

## FN15X102J500PNG
designator C?  Capacitance: 1nF  (hidden comment: *)
Capacitor, Ceramic (MLCC), 1nF, ±5%, 50V, X7R, ±5%, SMD 0402; Manufacturer: PSA(Prosperity Dielectrics); Manufacturer Part Number: FN15X102J500PNG; Package Size: 0402; JLCPCB Basic Part: No; JLCPCB Part Number: C363527; Supplier 1: LCSC; Category: Capacitors - MLCC; Supplier Part Number 1: C363527; Tolerance: ±5%; Voltage Rating: 50V; Temperature Coefficient: X7R; RoHS: Yes; ComponentLink1Description: Datasheet; ComponentLink1URL: https://wmsc.lcsc.com/wmsc/upload/file/pdf/v2/lcsc/2304140030_PSA-Prosperity-Dielectrics-FN15X102J500PNG_C363527.pdf; ComponentLink2Description: JLCPCB Part URL; ComponentLink2URL: https://jlcpcb.com/partdetail/C363527; ComponentLink3Description: LCSC Part URL; ComponentLink3URL: https://lcsc.com/product-detail/Multilayer-Ceramic-Capacitors-MLCC---SMD-SMT_PSAProsperity-Dielectrics-PSAProsperity-Dielectrics-FN15X102J500PNG_C363527.html
footprint CAP-0402 (0402 (1005M) Capacitor)
pins: 1, 2
